# Altium schematic symbol library FPGA_Xilinx_Virtex5.SchLib: 41 symbols (part 16 of 17) (continued)
## XC5VTX150T-FF1759 (continued)
part V pins: AA21 VREFN_0, AA22 VP_0, AB21 VN_0, AB22 VREFP_0, AC21 DXN_0, AC22 DXP_0, AF15 TMS_0, AF16 TCK_0, AG16 TDI_0, AG29 D_OUT_BUSY_0, AH16 TDO_0, AH28 M2_0, AJ16 CCLK_0, AJ27 M1_0, AJ28 M0_0, P13 VCCO_0, P15 RDWR_B_0, R14 DONE_0, R15 D_IN_0, R16 VCCO_0, R29 PROGRAM_B_0, T14 INIT_B_0, T29 HSWAPEN_0, T30 CS_B_0
part W pins: A6 GND, A7 GND, A12 GND, A13 GND, A18 GND, A19 GND, A23 GND, A24 GND, A25 GND, A30 GND, A31 GND, A36 GND, A37 GND, AA12 VCCAUX, AA14 VCCINT, AA16 VCCINT, AA18 VCCINT, AA20 VCCINT, AA24 VCCINT, AA26 VCCINT, AA28 VCCAUX, AB13 VCCINT, AB15 VCCINT, AB17 VCCINT, AB19 VCCINT, AB23 VCCINT, AB25 VCCINT, AB27 VCCINT, AB29 VCCAUX, AC12 VCCAUX, AC14 VCCINT, AC16 VCCINT, AC18 VCCINT, AC20 VCCINT, AC24 VCCINT, AC26 VCCINT, AC28 VCCINT, AD13 VCCAUX, AD15 VCCINT, AD17 VCCINT, AD19 VCCINT, AD21 VCCINT, AD23 VCCINT, AD25 VCCINT, AD27 VCCINT, AD29 VCCAUX, AE12 VCCAUX, AE14 VCCINT, AE16 VCCINT, AE18 VCCINT, AE20 VCCINT, AE22 VCCINT, AE24 VCCINT, AE26 VCCINT, AE28 VCCINT, AE30 VCCAUX, AF13 VCCAUX, AF17 VCCINT, AF19 VCCINT, AF21 VCCINT, AF23 VCCINT, AF25 VCCINT, AF27 VCCINT, AG18 VCCINT, AG20 VCCINT, AG22 VCCINT, AG24 VCCINT, AG26 VCCINT, AG28 VCCAUX, AG30 VCCAUX, AH19 VCCINT, AH21 VCCINT, AH23 VCCINT, AH25 VCCINT, AH27 VCCINT, AJ20 VCCINT, AJ22 VCCINT, AJ26 VCCINT, B3 GND, B4 GND, B9 GND, B10 GND, B15 GND, B16 GND, B19 GND, B20 GND, B24 GND, B27 GND, B28 GND, B33 GND, B34 GND, B39 GND, B40 GND, C6 GND, C12 GND, C18 GND, C19 GND, C24 GND, C25 GND, C31 GND, C37 GND, D1 GND, D3 GND, D5 GND, D6 GND, D7 GND, D8 GND, D9 GND, D11 GND, D12 GND, D13 GND, D14 GND, D15 GND, D17 GND, D18 GND, D19 GND, D24 GND, D25 GND, D26 GND, D28 GND, D29 GND, D30 GND, D31 GND, D32 GND, D34 GND, D35 GND, D36 GND, D37 GND, D38 GND, D40 GND, D42 GND, E4 GND, E5 GND, E6 GND, E9 GND, E10 GND, E11 GND, E15 GND, E16 GND, E17 GND, E21 GND, E26 GND, E27 GND, E28 GND, E31 GND, E32 GND, E33 GND, E34 GND, E38 GND, E39 GND, F2 GND, F5 GND, F8 GND, F18 GND, F28 GND, F33 GND, F38 GND, F41 GND, G2 GND, G4 GND, G5 GND, G15 GND, G25 GND, G35 GND, G38 GND, N20 VCCINT, P23 VCCINT, R18 VCCINT, R20 VCCINT, R22 VCCINT, R24 VCCINT, R28 VBATT_0, T13 VCCAUX, T15 VCCINT, T17 VCCINT, T19 VCCINT, T21 VCCINT, T23 VCCINT, T25 VCCINT, T27 VCCINT, U14 VCCINT, U16 VCCINT, U18 VCCINT, U20 VCCINT, U22 VCCINT, U24 VCCINT, U26 VCCINT, U28 VCCAUX, V13 VCCAUX, V15 VCCINT, V17 VCCINT, V19 VCCINT, V21 VCCINT, V23 VCCINT, V25 VCCINT, V27 VCCINT, V29 VCCAUX, W12 VCCAUX, W14 VCCINT, W16 VCCINT, W18 VCCINT, W20 VCCINT, W22 VCCINT, W24 VCCINT, W26 VCCINT, W28 VCCAUX, Y13 VCCAUX, Y15 VCCINT, Y17 VCCINT, Y19 VCCINT, Y21 AVSS_0, Y22 AVDD_0, Y23 VCCINT, Y25 VCCINT, Y27 VCCINT
part X pins: AA1 GND, AA5 GND, AA13 GND, AA15 GND, AA17 GND, AA19 GND, AA23 GND, AA25 GND, AA27 GND, AA29 GND, AA33 GND, AA38 GND, AA42 GND, AB1 GND, AB3 GND, AB5 GND, AB10 GND, AB12 GND, AB14 GND, AB16 GND, AB18 GND, AB20 GND, AB24 GND, AB26 GND, AB28 GND, AB30 GND, AB38 GND, AB40 GND, AB42 GND, AC4 GND, AC5 GND, AC7 GND, AC13 GND, AC15 GND, AC17 GND, AC19 GND, AC23 GND, AC25 GND, AC27 GND, AC29 GND, AC37 GND, AC38 GND, AC39 GND, AD2 GND, AD5 GND, AD12 GND, AD14 GND, AD16 GND, AD18 GND, AD20 GND, AD22 GND, AD24 GND, AD26 GND, AD28 GND, AD34 GND, AD38 GND, AD41 GND, AE2 GND, AE4 GND, AE5 GND, AE6 GND, AE11 GND, AE13 GND, AE15 GND, AE17 GND, AE19 GND, AE21 GND, AE23 GND, AE25 GND, AE27 GND, AE29 GND, AE31 GND, AE38 GND, AE39 GND, AE41 GND, AF4 GND, AF8 GND, AF18 GND, AF20 GND, AF22 GND, AF24 GND, AF26 GND, AF28 GND, AF30 GND, AF38 GND, AF39 GND, AG1 GND, AG4 GND, AG5 GND, AG15 GND, AG17 GND, AG19 GND, AG21 GND, AG23 GND, AG25 GND, AG27 GND, AG35 GND, AG39 GND, AG42 GND, AH1 GND, AH3 GND, AH4 GND, AH12 GND, AH18 GND, AH20 GND, AH22 GND, AH24 GND, AH26 GND, AH32 GND, AH39 GND, AH40 GND, AH42 GND, AJ4 GND, AJ5 GND, AJ9 GND, AJ19 GND, AJ21 GND, AJ23 GND, AJ29 GND, AJ38 GND, AJ39 GND, AK2 GND, AK5 GND, AK6 GND, AK16 GND, AK26 GND, AK36 GND, AK38 GND, AK41 GND, AL2 GND, AL4 GND, AL5 GND, AL13 GND, AL23 GND, AL33 GND, AL38 GND, AL39 GND, AL41 GND, AM4 GND, AM10 GND, AM20 GND, AM30 GND, AM39 GND, AN1 GND, AN4 GND, AN7 GND, AN17 GND, AN27 GND, AN37 GND, AN39 GND, AN42 GND, AP1 GND, AP3 GND, AP4 GND, AP14 GND, AP24 GND, AP34 GND, AP39 GND, AP40 GND, AP42 GND, G39 GND, G41 GND, H4 GND, H12 GND, H22 GND, H32 GND, H39 GND, J1 GND, J4 GND, J9 GND, J19 GND, J29 GND, J39 GND, J42 GND, K1 GND, K3 GND, K4 GND, K6 GND, K16 GND, K26 GND, K36 GND, K39 GND, K40 GND, K42 GND, L4 GND, L5 GND, L13 GND, L23 GND, L33 GND, L38 GND, L39 GND, M2 GND, M5 GND, M10 GND, M20 GND, M30 GND, M38 GND, M41 GND, N2 GND, N4 GND, N5 GND, N7 GND, N17 GND, N27 GND, N37 GND, N38 GND, N39 GND, N41 GND, P4 GND, P14 GND, P16 GND, P20 GND, P24 GND, P34 GND, P39 GND, R1 GND, R4 GND, R11 GND, R13 GND, R17 GND, R19 GND, R21 GND, R23 GND, R25 GND, R31 GND, R39 GND, R42 GND, T1 GND, T3 GND, T4 GND, T8 GND, T12 GND, T16 GND, T18 GND, T20 GND, T22 GND, T24 GND, T26 GND, T28 GND, T38 GND, T39 GND, T40 GND, T42 GND, U4 GND, U5 GND, U13 GND, U15 GND, U17 GND, U19 GND, U21 GND, U23 GND, U25 GND, U27 GND, U35 GND, U38 GND, U39 GND, V2 GND, V5 GND, V12 GND, V14 GND, V16 GND, V18 GND, V20 GND, V22 GND, V24 GND, V26 GND, V28 GND, V30 GND, V32 GND, V37 GND, V38 GND, V41 GND, W2 GND, W4 GND, W5 GND, W9 GND, W13 GND, W15 GND, W17 GND, W19 GND, W21 GND, W23 GND, W25 GND, W27 GND, W29 GND, W38 GND, W39 GND, W41 GND, Y4 GND, Y5 GND, Y6 GND, Y12 GND, Y14 GND, Y16 GND, Y18 GND, Y20 GND, Y24 GND, Y26 GND, Y28 GND, Y36 GND, Y38 GND, Y39 GND
part Y pins: AR4 GND, AR5 GND, AR11 GND, AR21 GND, AR31 GND, AR38 GND, AR39 GND, AT2 GND, AT5 GND, AT8 GND, AT18 GND, AT28 GND, AT38 GND, AT41 GND, AU2 GND, AU4 GND, AU5 GND, AU10 GND, AU15 GND, AU25 GND, AU35 GND, AU38 GND, AU39 GND, AU41 GND, AV4 GND, AV5 GND, AV6 GND, AV8 GND, AV9 GND, AV10 GND, AV12 GND, AV14 GND, AV15 GND, AV16 GND, AV17 GND, AV22 GND, AV27 GND, AV28 GND, AV29 GND, AV32 GND, AV33 GND, AV34 GND, AV35 GND, AV37 GND, AV38 GND, AV39 GND, AW1 GND, AW6 GND, AW7 GND, AW8 GND, AW10 GND, AW11 GND, AW12 GND, AW13 GND, AW14 GND, AW16 GND, AW17 GND, AW18 GND, AW19 GND, AW24 GND, AW25 GND, AW26 GND, AW27 GND, AW29 GND, AW30 GND, AW31 GND, AW32 GND, AW33 GND, AW35 GND, AW36 GND, AW37 GND, AW42 GND, AY1 GND, AY3 GND, AY7 GND, AY13 GND, AY19 GND, AY24 GND, AY30 GND, AY36 GND, AY40 GND, AY42 GND, BA3 GND, BA4 GND, BA9 GND, BA10 GND, BA15 GND, BA16 GND, BA19 GND, BA23 GND, BA24 GND, BA27 GND, BA28 GND, BA33 GND, BA34 GND, BA39 GND, BA40 GND, BB6 GND, BB7 GND, BB12 GND, BB13 GND, BB18 GND, BB19 GND, BB20 GND, BB24 GND, BB25 GND, BB30 GND, BB31 GND, BB36 GND, BB37 GND

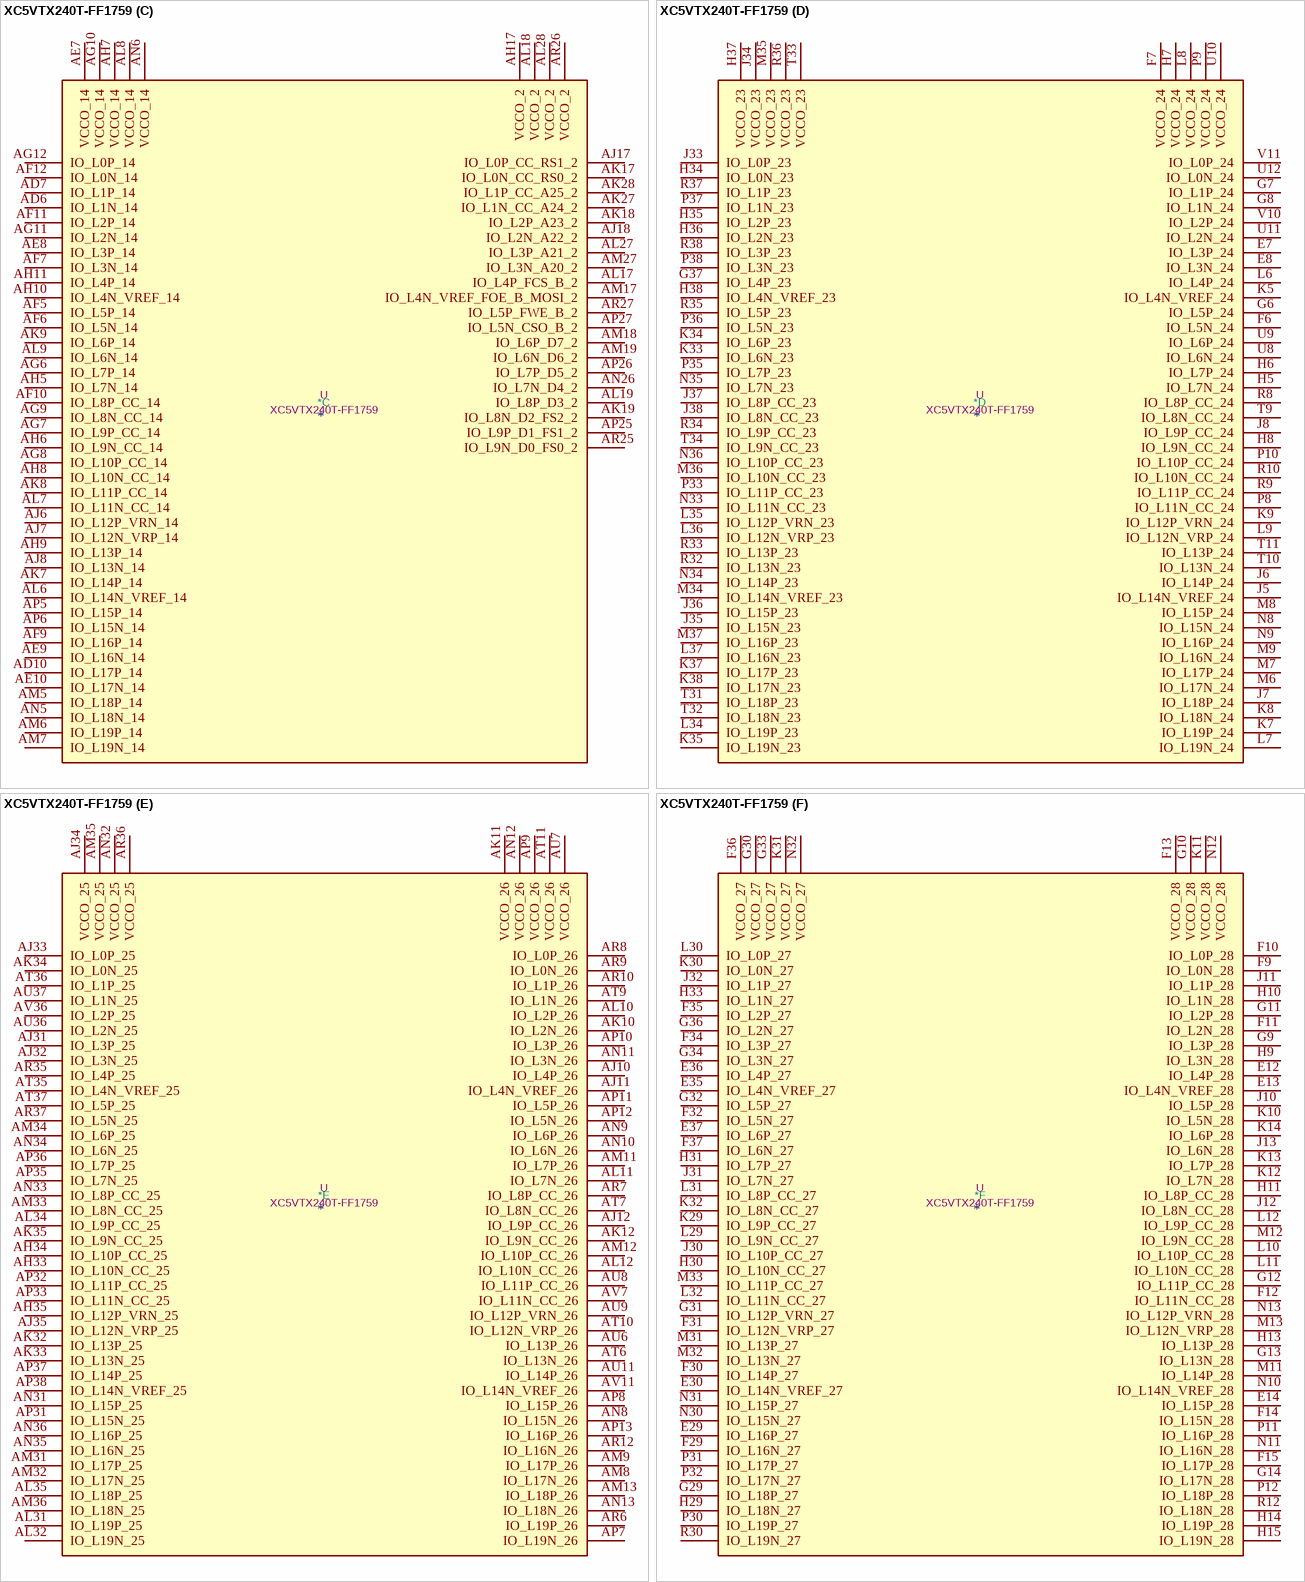
[diagram p134: symbol XC5VTX240T-FF1759]

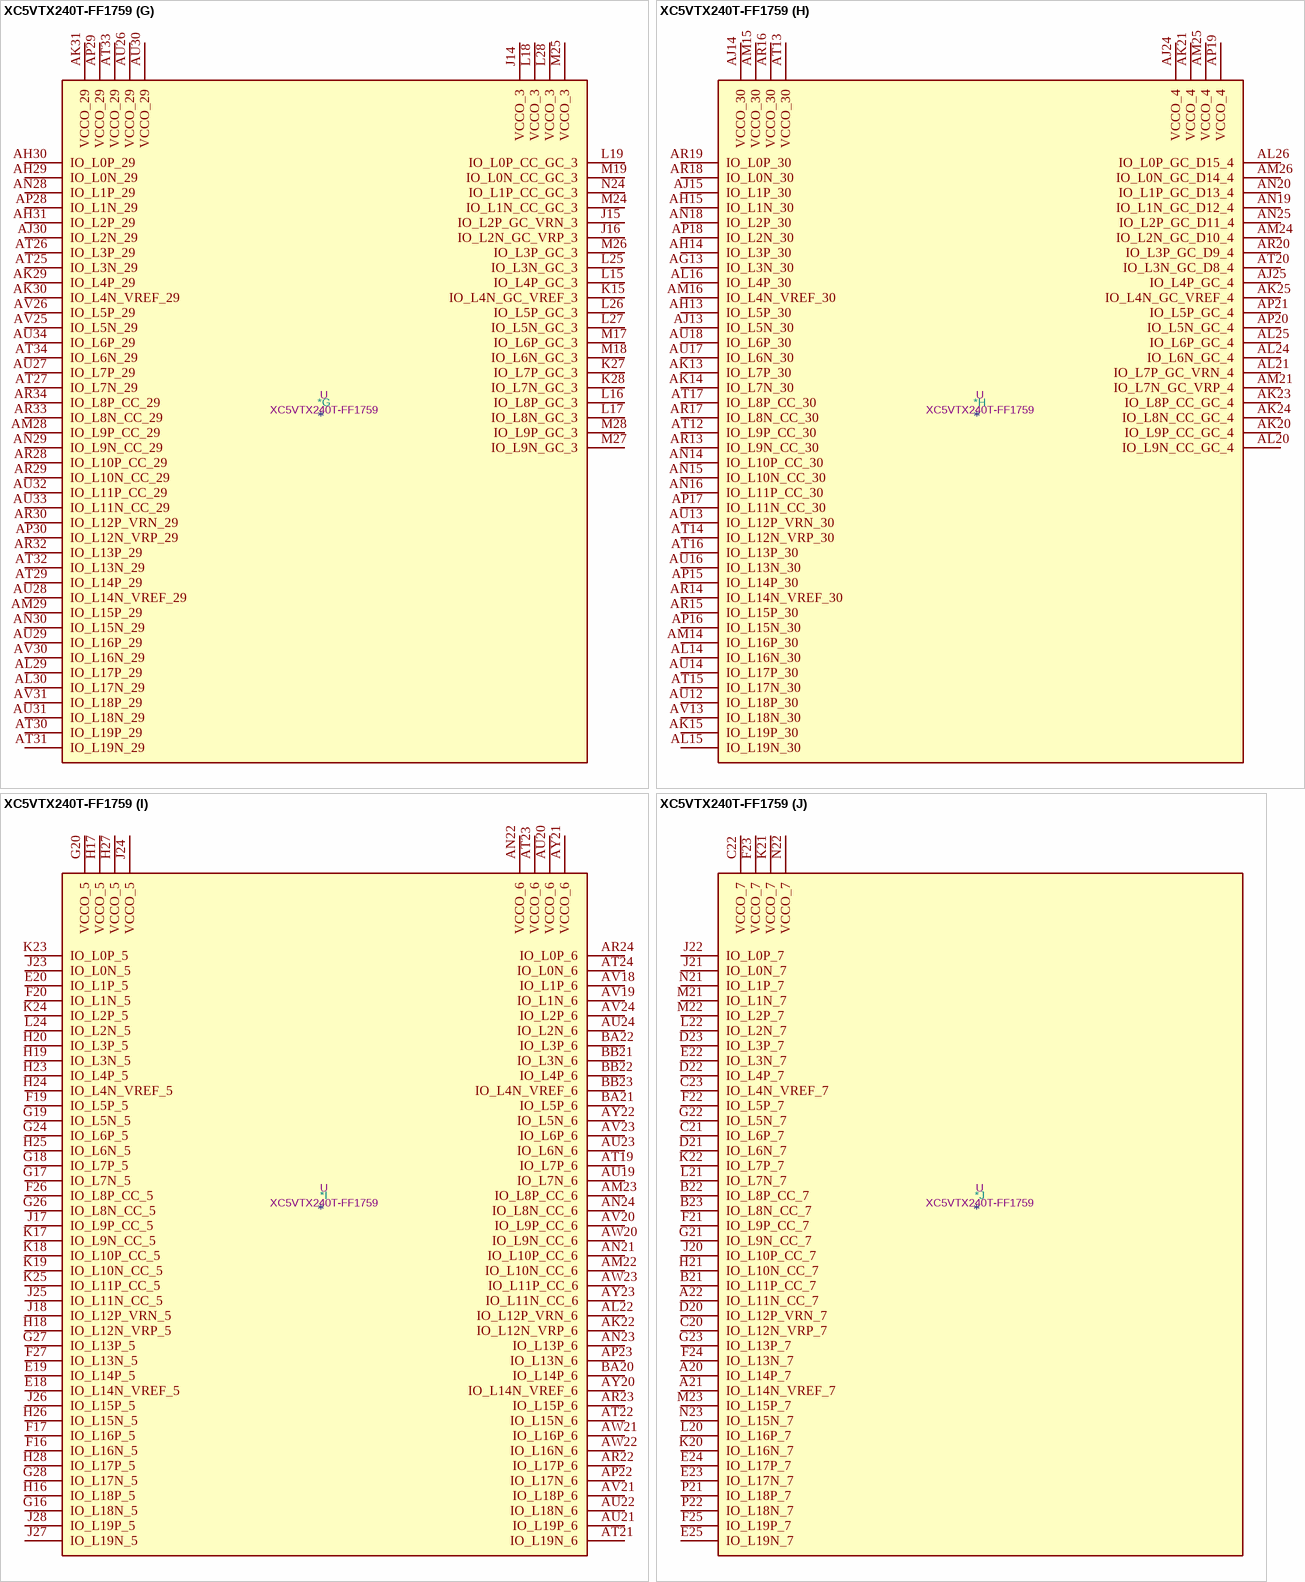
[diagram p135: symbol XC5VTX240T-FF1759]

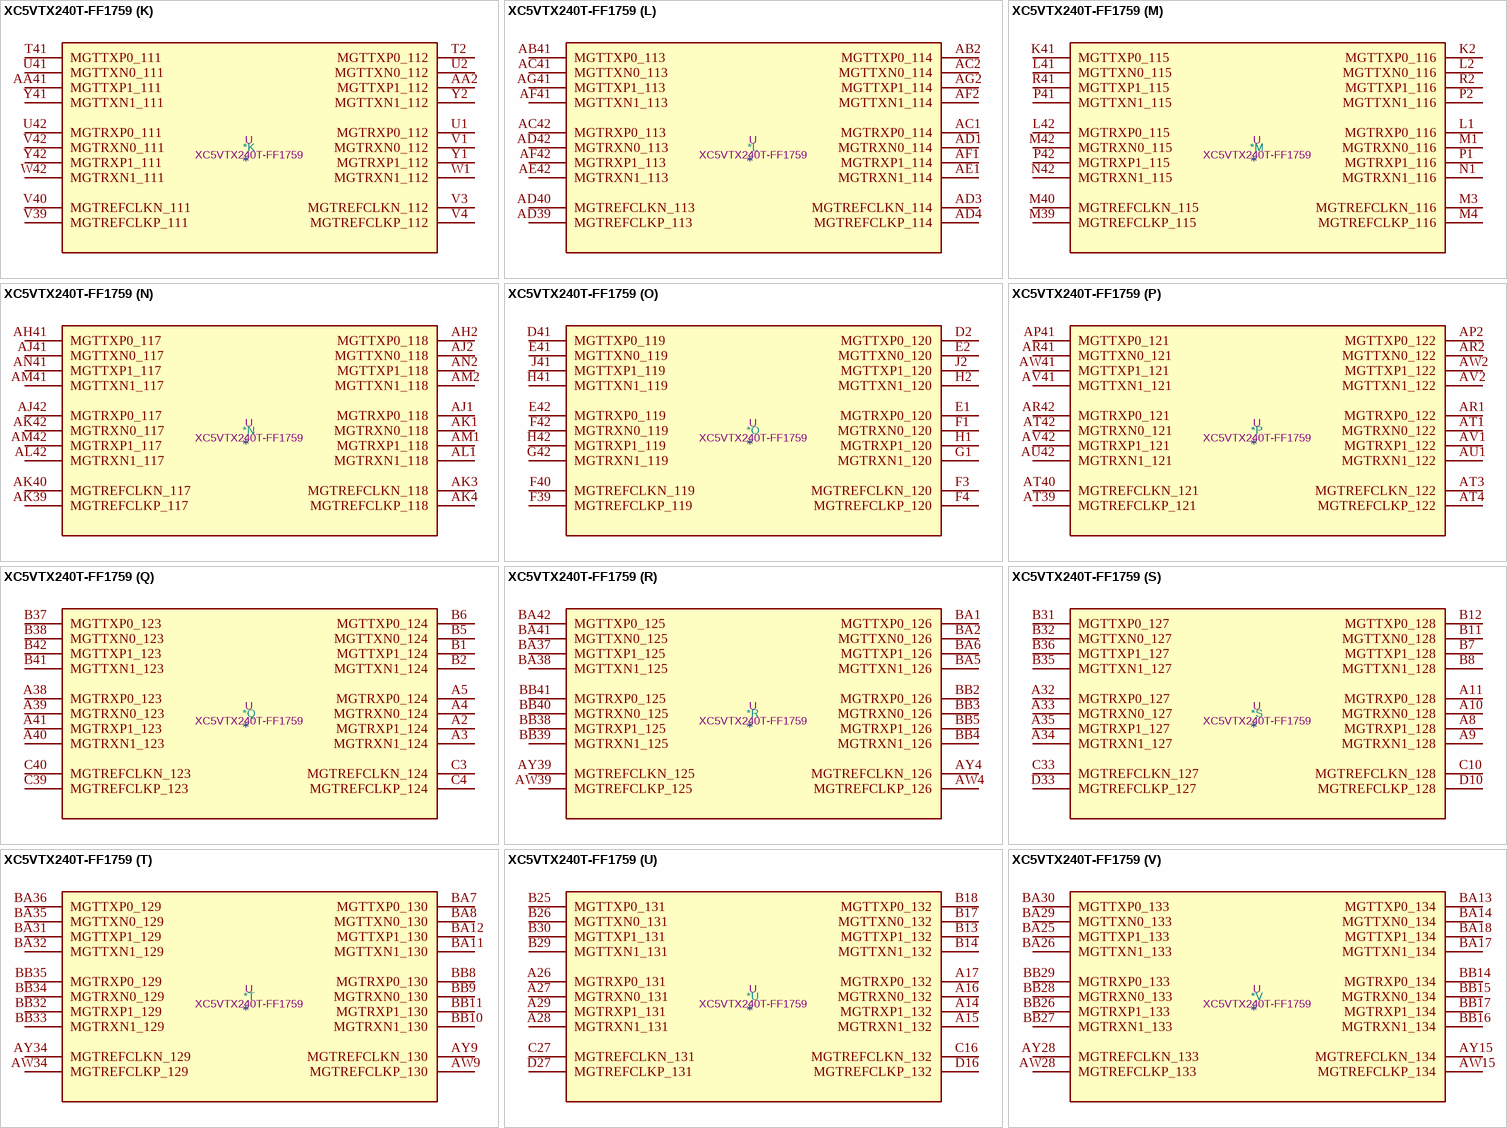
[diagram p136: symbol XC5VTX240T-FF1759]

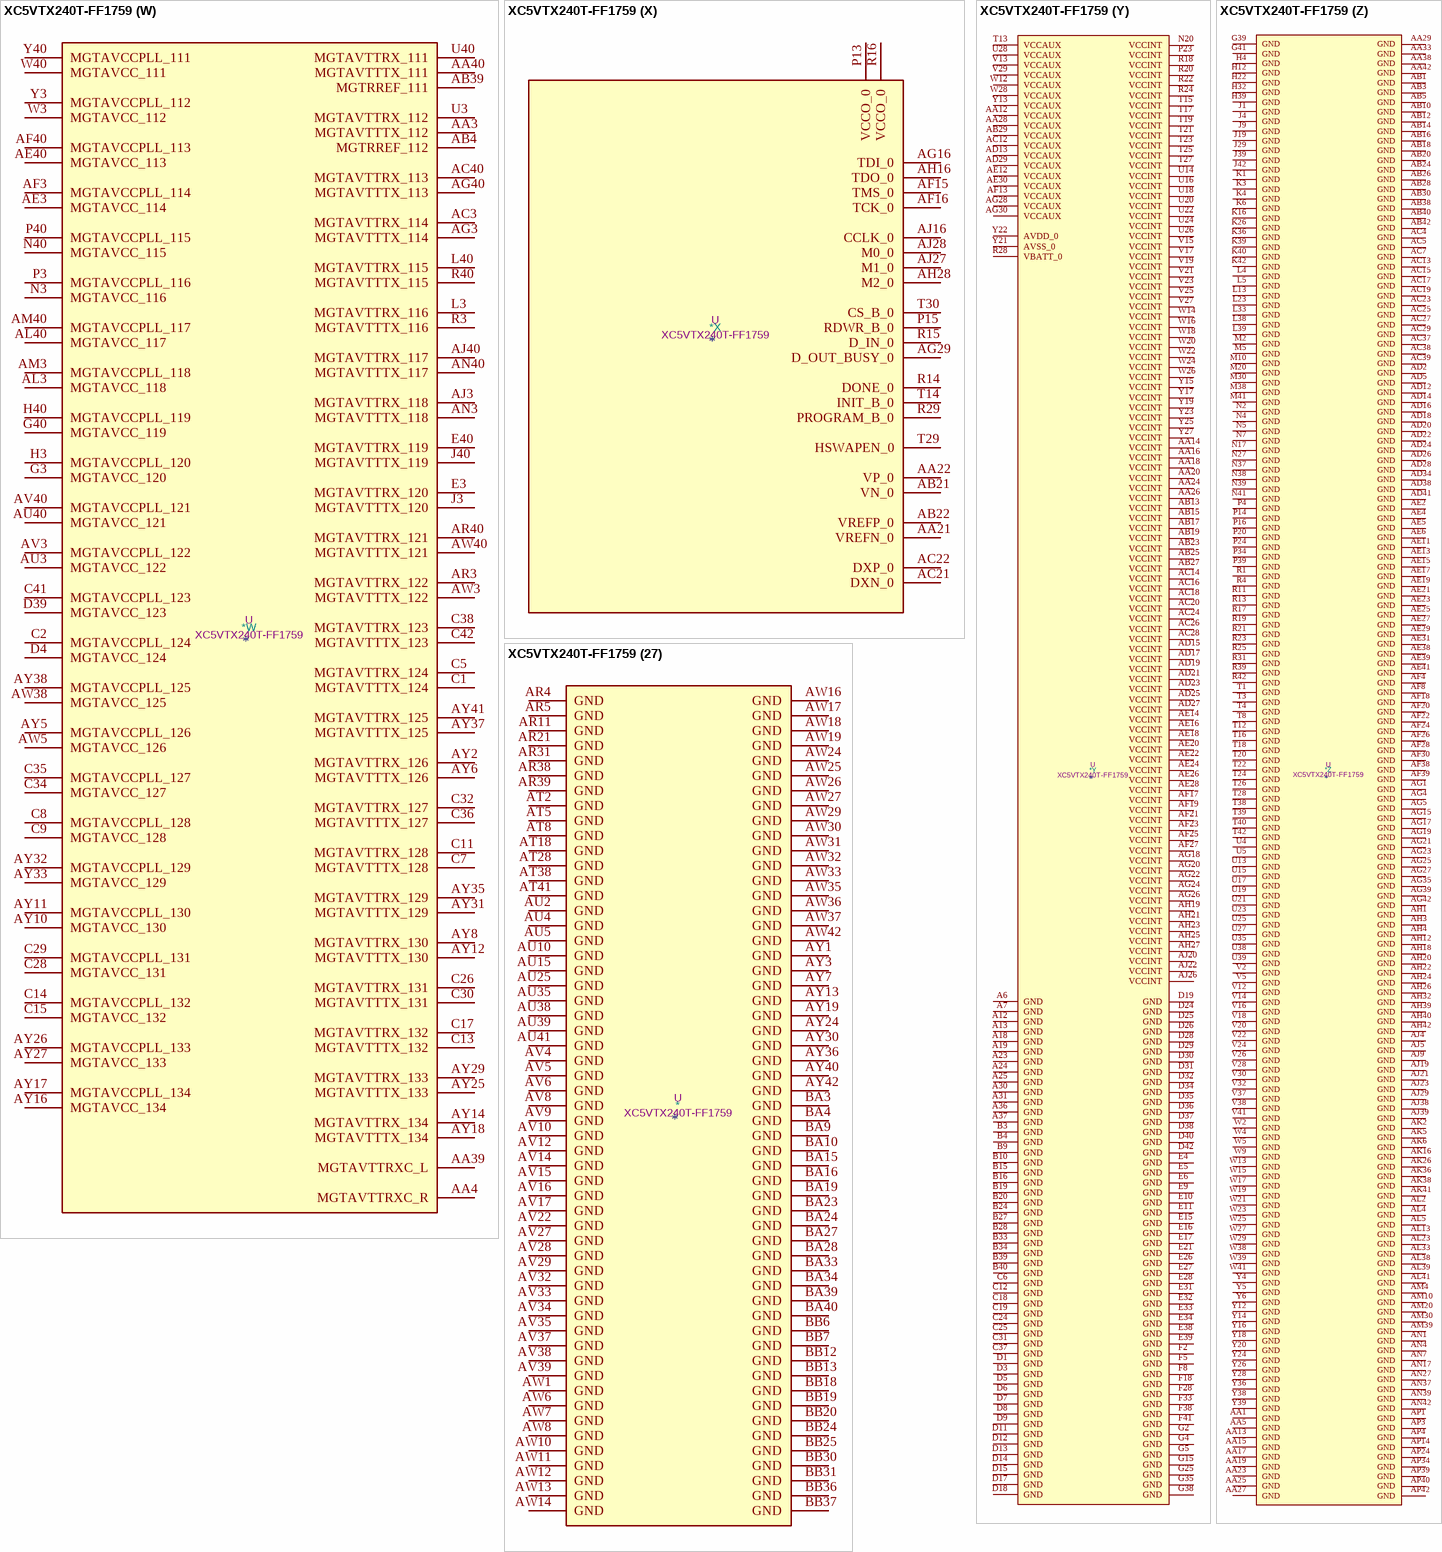
[diagram p137: symbol XC5VTX240T-FF1759]